# Altium footprint library Basal.PcbLib: 248 footprints (part 6 of 16)
Each footprint in its own frame and in the unit in brackets; x right, y up, seen from the top. Pads: shape width x height; smd on the part's side, far side on the other; paste and mask are expansions set on the pad; w line width, h text height; cw(c..) or ccw(c..) is an arc to the next point about the centre after c.
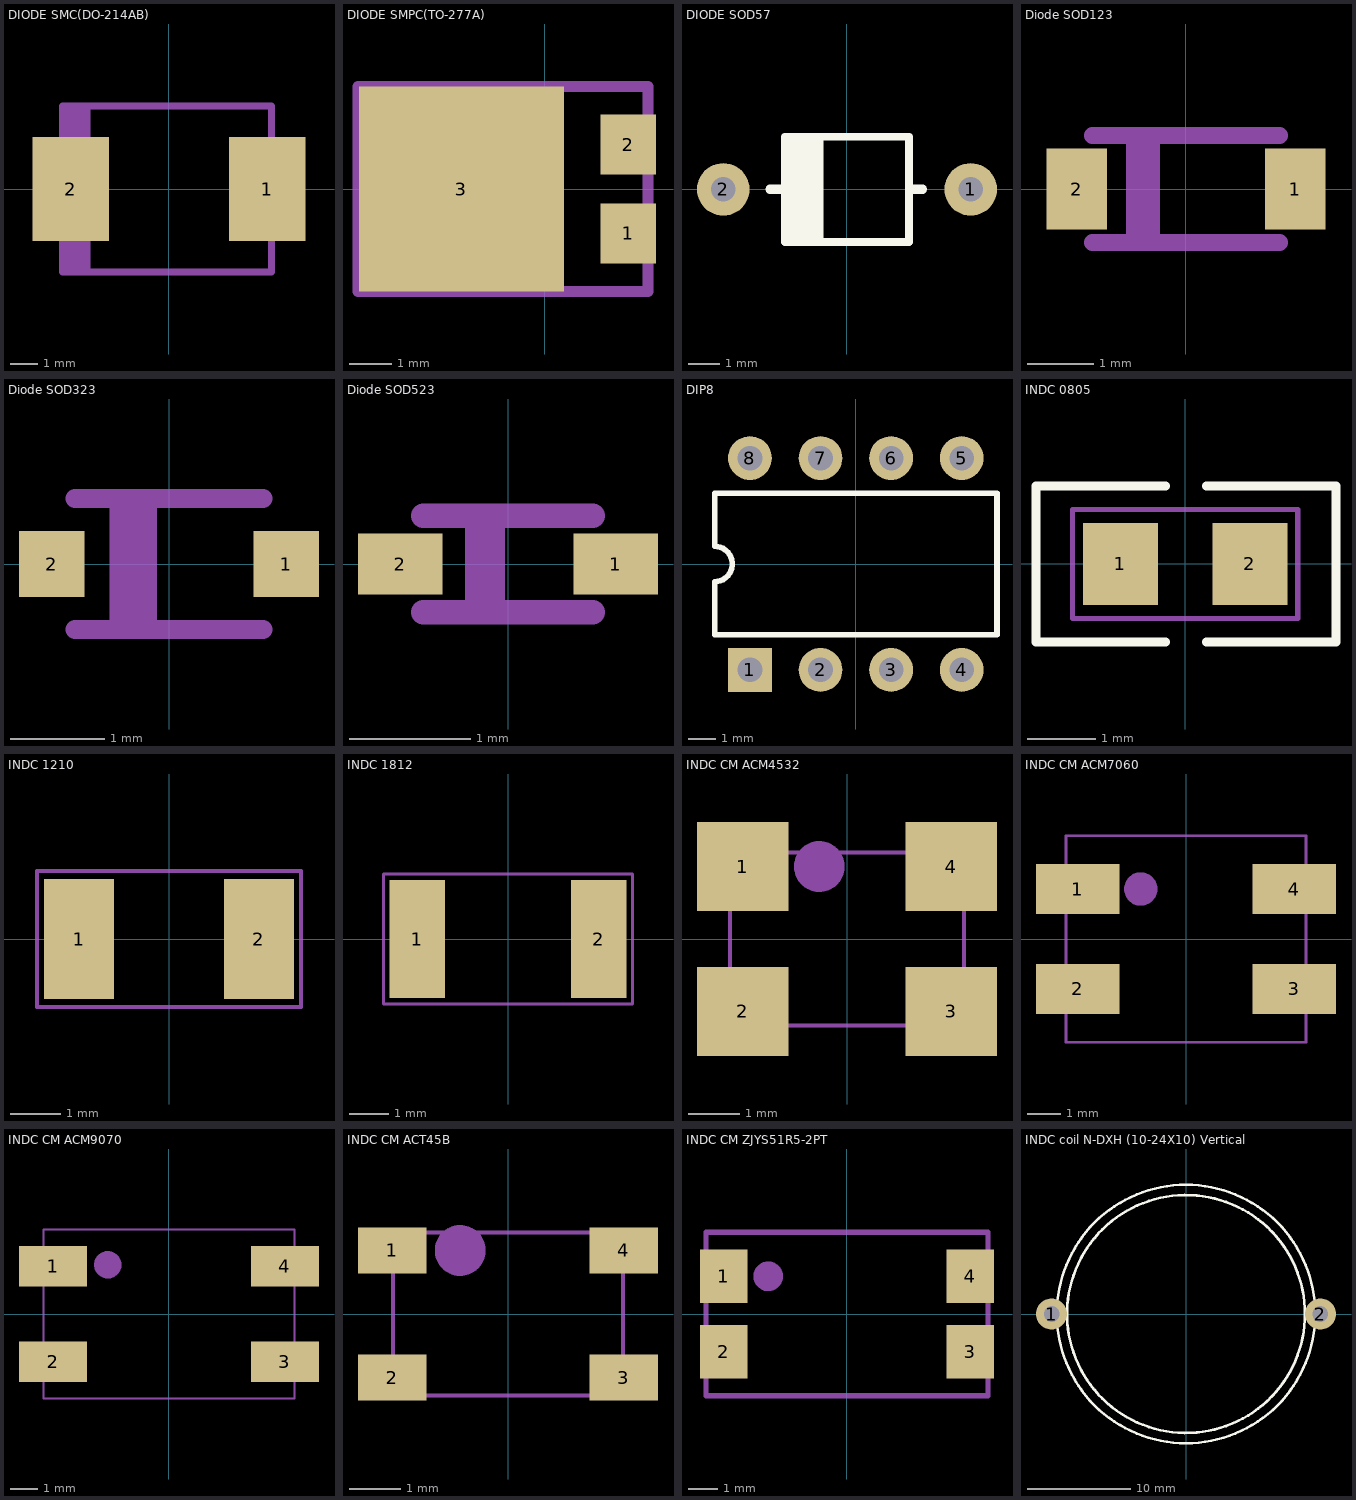
[diagram p5: the footprints below, top view; thin cyan lines are the x and y axes]

## DIODE SMC(DO-214AB) [mm] "SS54贴片肖特基二极管"
pads (2):
  rect 2.8x3.8 smd: 1(3.6,0) 2(-3.6,0)
Mechanical 15:
  lines w0.254: -3.683,-3.048 -3.683,3.048 ; -3.454,-3.048 -3.454,3.048 ; -3.226,-3.048 -3.226,3.048 ; -2.997,-3.048 -2.997,3.048 ; -3.912,-3.048 -3.912,3.048 3.759,3.048 3.759,-3.048 -3.912,-3.048
3D body "Diode Molded BodyDIOM7959X241N.STEP": height 2.38, standoff -0.03, extent -4.026,-2.95 3.874,2.95

## DIODE SMPC(TO-277A) [mm]
pads (3):
  rect 1.3x1.4 smd: 1(1.95,-1.04) 2(1.95,1.04)
  rect 4.8x4.8 smd: 3(-1.95,0)
Mechanical 15:
  lines w0.254: -4.14,-2.4 -4.14,2.4 ; -3.912,-2.4 -3.912,2.4 ; -3.683,-2.4 -3.683,2.4 ; -3.429,-2.4 -3.429,2.4 ; -4.369,-2.4 2.413,-2.4 2.413,2.4 -4.369,2.4 -4.369,-2.4
3D body "TO-277A(SMPC).STEP": height 1.2, standoff 0, extent -4.236,-2.375 2.414,2.375

## DIODE SOD57 [mm]
pads (2):
  round 1.7 hole 0.8: 1(4,0) 2(-4,0)
Top Overlay:
  region: -0.762,1.724 -2.062,1.724 -2.062,-1.676 -0.762,-1.676
  lines w0.254: -2,-1.7 -2,1.7 ; -1.981,-1.7 1.981,-1.7 ; -1.981,1.7 1.981,1.7 ; 2,-1.7 2,1.7
  lines w0.3: -2.489,0 -1.369,0 ; 2.032,0 2.438,0

## Diode SOD123 [mm] "贴片二极管SOD-123封装"
pads (2):
  rect 0.91x1.22 smd: 1(1.64,0) 2(-1.64,0)
Mechanical 15:
  lines w0.254: -1.4,-0.8 1.4,-0.8 ; -1.4,0.8 1.4,0.8 ; -0.773,-0.8 -0.773,0.8 ; -0.519,-0.8 -0.519,0.8
3D body "SOD-123.STEP": height 1.42, standoff -0.03, extent -1.925,-0.85 1.925,0.85

## Diode SOD323 [mm]
pads (2):
  rect 0.7x0.7 smd: 1(1.25,0) 2(-1.25,0)
Mechanical 15:
  lines w0.203: -1,-0.7 1,-0.7 ; -1,0.7 1,0.7
  lines w0.254: -0.508,-0.635 -0.508,0.635 ; -0.254,-0.635 -0.254,0.635
3D body "SOD-323.STEP": height 1.1, standoff 0, extent -1.3,-0.675 1.3,0.675

## Diode SOD523 [mm]
pads (2):
  rect 0.7x0.5 smd: 1(0.889,0) 2(-0.889,0)
Mechanical 15:
  lines w0.203: -0.7,-0.4 0.7,-0.4 ; -0.7,0.4 0.7,0.4 ; -0.254,-0.381 -0.254,0.381 ; -0.127,-0.4 -0.127,0.4
3D body: height 0.8, standoff 0, extent -0.826,-0.445 0.826,0.445
3D body: height 0.81, standoff 0, extent -0.381,-0.445 -0.127,0.445

## DIP8 [mil]
pads (8):
  rect 62x62 hole 35: 1(-150,-150)
  round 62 hole 35: 2(-50,-150) 3(50,-150) 4(150,-150) 5(150,150) 6(50,150) 7(-50,150) 8(-150,150)
Top Overlay:
  lines w7.87: -200,-100 200,-100 200,100 -200,100 -200,25 cw(c-200,0) -200,-25 -200,-100
3D body "DIP-8.STEP": height 179.92, standoff -150, extent -195.09,-153.93 195.07,153.94

## INDC 0805 [mm] "贴片电感0805封装"
height 0.5
pads (2):
  rect 1.1x1.2 smd paste-2: 1(-0.95,0) 2(0.95,0)
Top Overlay:
  lines w0.127: -0.282,-1.143 -2.187,-1.143 -2.187,1.143 -0.282,1.143 ; 0.307,-1.143 2.212,-1.143 2.212,1.143 0.307,1.143
Top Paste:
  region: 0.452,0.459 0.452,0.479 0.467,0.515 0.496,0.544 0.532,0.559 0.552,0.559 1.348,0.559 1.368,0.559 1.404,0.544 1.433,0.515 1.448,0.479 1.448,0.459 1.448,-0.459 1.448,-0.479 1.433,-0.515 1.404,-0.544 1.368,-0.559 1.348,-0.559 0.552,-0.559 0.532,-0.559 0.496,-0.544 0.467,-0.515 0.452,-0.479 0.452,-0.459 0.452,-0.3 0.452,-0.28 0.467,-0.243 0.496,-0.215 0.532,-0.2 0.552,-0.2 0.648,-0.2 0.687,-0.196 0.759,-0.166 0.814,-0.111 0.844,-0.039 0.844,0.039 0.814,0.111 0.759,0.166 0.687,0.196 0.648,0.2 0.552,0.2 0.532,0.2 0.496,0.215 0.467,0.243 0.452,0.28 0.452,0.3
  region: -0.452,-0.459 -0.452,-0.479 -0.467,-0.515 -0.496,-0.544 -0.532,-0.559 -0.552,-0.559 -1.348,-0.559 -1.368,-0.559 -1.404,-0.544 -1.433,-0.515 -1.448,-0.479 -1.448,-0.459 -1.448,0.459 -1.448,0.479 -1.433,0.515 -1.404,0.544 -1.368,0.559 -1.348,0.559 -0.552,0.559 -0.532,0.559 -0.496,0.544 -0.467,0.515 -0.452,0.479 -0.452,0.459 -0.452,0.3 -0.452,0.28 -0.467,0.243 -0.496,0.215 -0.532,0.2 -0.552,0.2 -0.648,0.2 -0.687,0.196 -0.759,0.166 -0.814,0.111 -0.844,0.039 -0.844,-0.039 -0.814,-0.111 -0.759,-0.166 -0.687,-0.196 -0.648,-0.2 -0.552,-0.2 -0.532,-0.2 -0.496,-0.215 -0.467,-0.243 -0.452,-0.28 -0.452,-0.3
Mechanical 15:
  lines w0.076: -1.651,-0.8 1.651,-0.8 1.651,0.8 -1.651,0.8 -1.651,-0.8
3D body: height 0.76, standoff 0, extent -1,-0.6 1,0.6

## INDC 1210 [mm] "贴片电感1210封装"
height 0.5
pads (2):
  rect 1.4x2.4 smd paste-3: 1(-1.8,0) 2(1.8,0)
Top Paste:
  region: -1.157,-1.043 -1.157,-1.063 -1.172,-1.1 -1.2,-1.128 -1.237,-1.143 -1.257,-1.143 -2.343,-1.143 -2.363,-1.143 -2.4,-1.128 -2.428,-1.1 -2.443,-1.063 -2.443,-1.043 -2.443,1.043 -2.443,1.063 -2.428,1.1 -2.4,1.128 -2.363,1.143 -2.343,1.143 -1.257,1.143 -1.237,1.143 -1.2,1.128 -1.172,1.1 -1.157,1.063 -1.157,1.043 -1.157,0.5 -1.157,0.48 -1.172,0.443 -1.2,0.415 -1.237,0.4 -1.257,0.4 -1.335,0.392 -1.479,0.333 -1.59,0.222 -1.649,0.078 -1.649,-0.078 -1.59,-0.222 -1.479,-0.333 -1.335,-0.392 -1.257,-0.4 -1.237,-0.4 -1.2,-0.415 -1.172,-0.443 -1.157,-0.48 -1.157,-0.5
  region: 1.157,1.043 1.157,1.063 1.172,1.1 1.2,1.128 1.237,1.143 1.257,1.143 2.343,1.143 2.363,1.143 2.4,1.128 2.428,1.1 2.443,1.063 2.443,1.043 2.443,-1.043 2.443,-1.063 2.428,-1.1 2.4,-1.128 2.363,-1.143 2.343,-1.143 1.257,-1.143 1.237,-1.143 1.2,-1.128 1.172,-1.1 1.157,-1.063 1.157,-1.043 1.157,-0.5 1.157,-0.48 1.172,-0.443 1.2,-0.415 1.237,-0.4 1.257,-0.4 1.335,-0.392 1.479,-0.333 1.59,-0.222 1.649,-0.078 1.649,0.078 1.59,0.222 1.479,0.333 1.335,0.392 1.257,0.4 1.237,0.4 1.2,0.415 1.172,0.443 1.157,0.48 1.157,0.5
Mechanical 15:
  lines w0.076: -2.642,-1.359 2.642,-1.359 2.642,1.359 -2.642,1.359 -2.642,-1.359
3D body: height 2.29, standoff 0, extent -1.802,-1.399 1.802,1.399

## INDC 1812 [mm] "贴片电感1210封装"
height 0.5
pads (2):
  rect 1.4x3 smd: 1(-2.3,0) 2(2.3,0)
Mechanical 15:
  lines w0.076: -3.15,-1.651 3.15,-1.651 3.15,1.651 -3.15,1.651 -3.15,-1.651
3D body "C1812_1.STEP": height 2.8, standoff 0, extent -2.45,-1.8 2.45,1.8

## INDC CM ACM4532 [mm]
pads (4):
  rect 1.8x1.75 smd: 1(-2.05,1.425) 2(-2.05,-1.425) 3(2.05,-1.425) 4(2.05,1.425)
Mechanical 15:
  circle w0.5: c-0.544,1.425 r0.25
  lines w0.076: -2.3,-1.7 -2.3,1.7 2.3,1.7 2.3,-1.7 -2.3,-1.7
3D body "ACM4532.STEP": height 3, standoff 0, extent -2.15,-1.6 2.15,1.6

## INDC CM ACM7060 [mm]
pads (4):
  rect 2.5x1.5 smd: 1(-3.25,1.5) 2(-3.25,-1.5) 3(3.25,-1.5) 4(3.25,1.5)
Mechanical 15:
  circle w0.5: c-1.357,1.5 r0.25
  lines w0.076: -3.6,-3.1 3.6,-3.1 3.6,3.1 -3.6,3.1 -3.6,-3.1
3D body "ACM7060.STEP": height 3.5, standoff 0, extent -3.5,-3 3.5,3

## INDC CM ACM9070 [mm]
pads (4):
  rect 2.5x1.5 smd: 1(-4.25,1.75) 2(-4.25,-1.75) 3(4.25,-1.75) 4(4.25,1.75)
Mechanical 15:
  circle w0.5: c-2.246,1.804 r0.25
  lines w0.076: -4.6,-3.1 -4.6,3.1 4.6,3.1 4.6,-3.1 -4.6,-3.1
3D body "ACM70V.STEP": height 3.5, standoff 0, extent -3.5,-3 3.5,3

## INDC CM ACT45B [mm]
pads (4):
  rect 1.35x0.9 smd: 1(-2.275,1.25) 2(-2.275,-1.25) 3(2.275,-1.25) 4(2.275,1.25)
Mechanical 15:
  circle w0.5: c-0.94,1.25 r0.25
  lines w0.076: -2.261,-1.6 -2.261,1.6 2.261,1.6 2.261,-1.6 -2.261,-1.6
3D body: height 3, standoff 0, extent -2.25,-1.6 2.25,1.6

## INDC CM ZJYS51R5-2PT [mm]
pads (4):
  rect 1.6x1.8 smd: 1(-4.15,1.27) 2(-4.15,-1.27) 3(4.15,-1.27) 4(4.15,1.27)
Mechanical 15:
  circle w0.5: c-2.653,1.27 r0.25
  lines w0.178: -4.75,-2.75 4.75,-2.75 4.75,2.75 -4.75,2.75 -4.75,-2.75
3D body "ZJYS81R5.STEP": height 5, standoff 0, extent -4.408,-3 4.592,3

## INDC coil N-DXH (10-24X10) Vertical [mm]
pads (2):
  round 3 hole 1.5: 1(-13,0) 2(13,0)
Top Overlay:
  circle w0.254: c0,0 r11.5
  circle w0.254: c0,0 r12.5
3D body: height 18.02, standoff 0.01, extent -11.5,-11.497 11.5,11.497
3D body: height 18, standoff 0, extent -12.5,-12.496 12.5,12.497